# Altium footprint library 逸芬的库鸭.PcbLib: 255 footprints (part 3 of 20)
Each footprint in its own frame and in the unit in brackets; x right, y up, seen from the top. Pads: shape width x height; smd on the part's side, far side on the other; paste and mask are expansions set on the pad; w line width, h text height; cw(c..) or ccw(c..) is an arc to the next point about the centre after c.
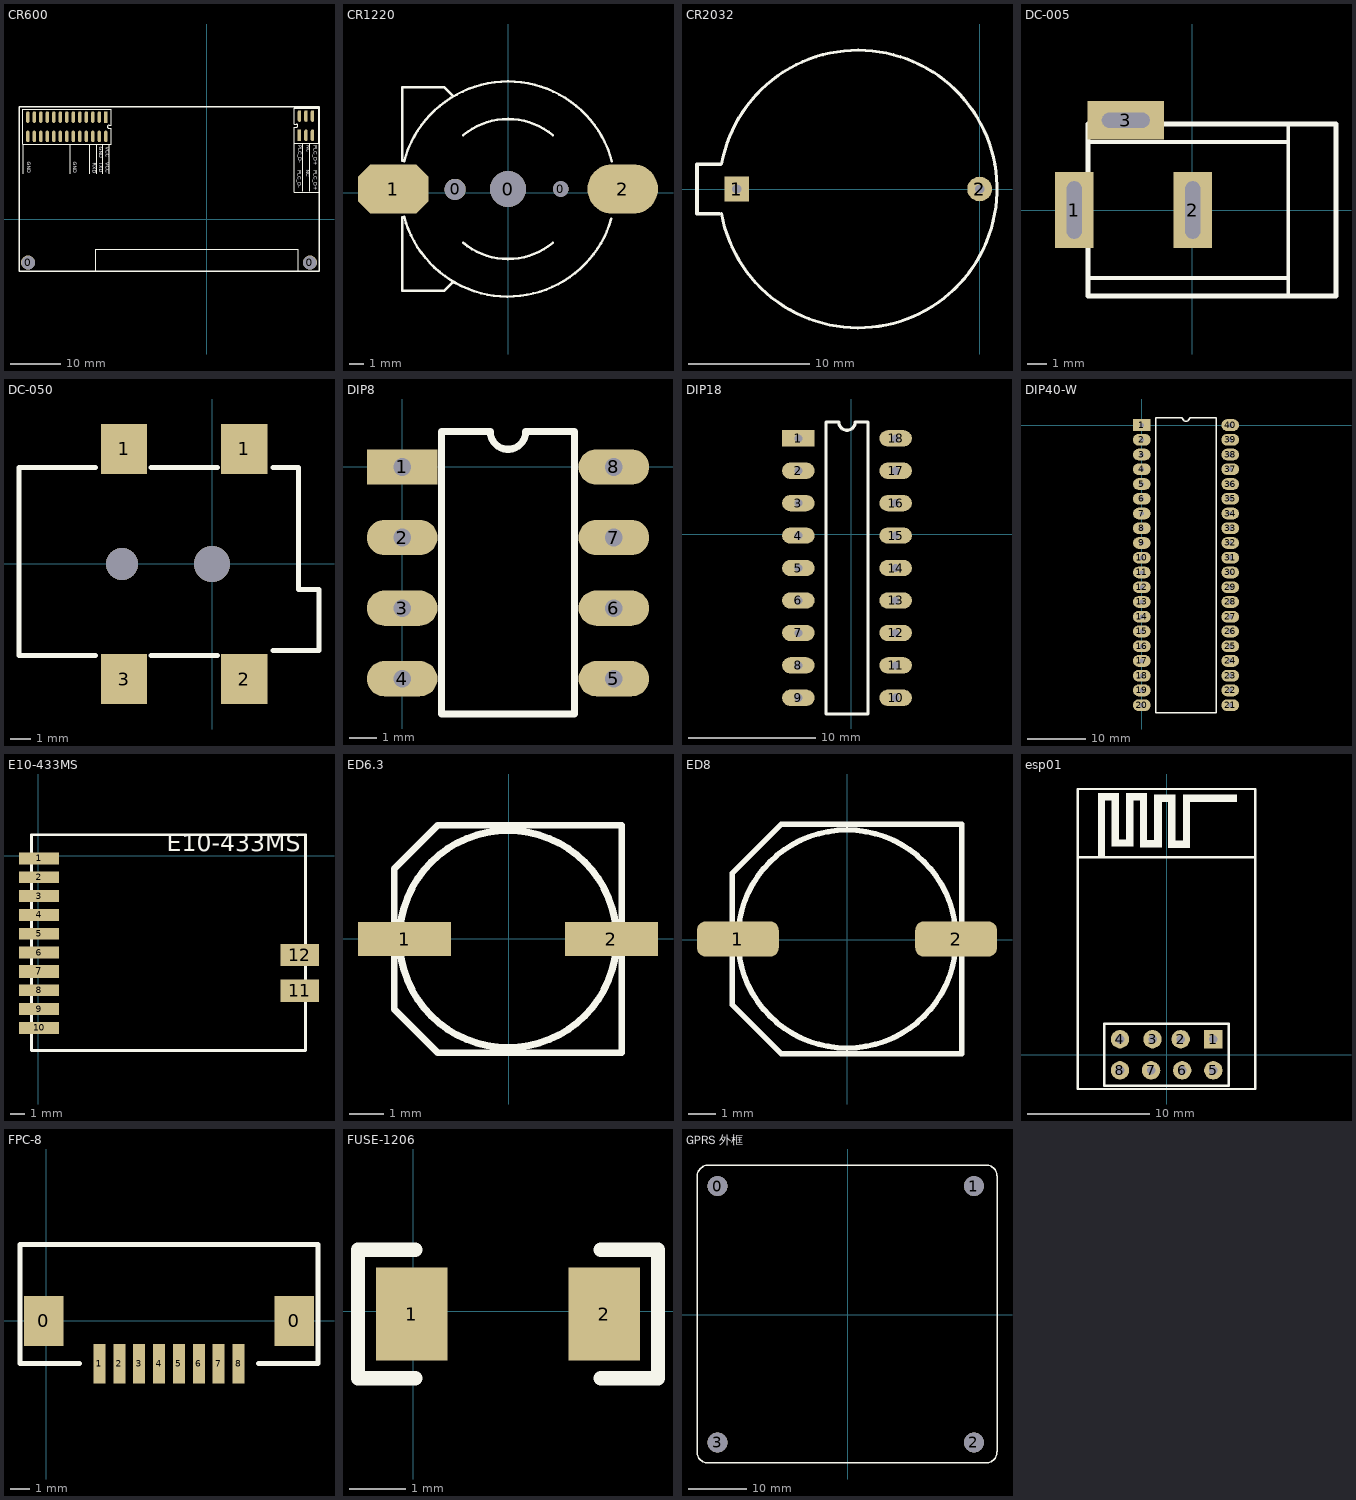
[diagram p2: the footprints below, top view; thin cyan lines are the x and y axes]

## CR600 [mm]
pads (34):
  round 2.8 hole 2.7: 0(-35.7,-8.7) 0(20.7,-8.7)
  rect 0.7x2.3 smd: 1(-20.14,20.374) 31(18.594,16.739)
  oval 0.7x2.3 smd: 2(-20.14,16.524) 3(-21.44,20.374) 4(-21.44,16.524) 5(-22.74,20.374) 6(-22.74,16.524) 7(-24.04,20.374) 8(-24.04,16.524) 9(-25.34,20.374) 10(-25.34,16.524) 11(-26.64,20.374) 12(-26.64,16.524) 13(-27.94,20.374) 14(-27.94,16.524) 15(-29.24,20.374) 16(-29.24,16.524) 17(-30.54,20.374) 18(-30.54,16.524) 19(-31.84,20.374) 20(-31.84,16.524) 21(-33.14,20.374) 22(-33.14,16.524) 23(-34.44,20.374) 24(-34.44,16.524) 25(-35.74,20.374) 26(-35.74,16.524) 32(18.594,20.589) 33(19.894,16.739) 34(19.894,20.589) 35(21.194,16.739) 36(21.194,20.589)
Top Overlay:
  lines w0.127: -36.7,9.1 -36.7,14.9 ; -27.3,9.1 -27.3,14.9 ; -23.4,9.1 -23.4,14.9 ; -22.2,-10.5 -22.2,-6 18.4,-6 18.4,-10.5 ; -22,9.1 -22,14.9 ; -20.8,9.1 -20.8,14.9 ; -19.5,9.1 -19.5,14.9 ; 17.5,15.113 17.5,5.4 22.5,5.4 ; 19.3,5.51 19.3,15.1 ; 20.7,5.51 20.7,15.1
  lines w0.2: 17.5,15.113 17.5,18.339 17.944,18.339 ccw(c17.944,18.664) 17.944,18.989 17.553,18.989 17.553,22.2 ; -36.726,14.913 -36.726,22 -19.099,22 -19.099,18.774 -19.49,18.774 ccw(c-19.49,18.449) -19.49,18.124 -19.099,18.124 -19.099,14.913 -36.726,14.913
  lines w0.203: 17.5,15.113 22.455,15.113
  lines w0.254: 17.553,22.2 22.379,22.2 ; 22.43,15.139 22.455,15.113 22.455,22.124 ; -37.5,-10.5 22.5,-10.5 22.5,22.5 -37.5,22.5 -37.5,-10.5
  text "NC" at 19.6,9.804 h1.27
  text "PLC_D-" at 18,9.8 h1.27
  text "PLC_D+" at 21.1,9.8 h1.27
  text "GND" at -36.2,11.5 h1.27
  text "GND" at -27,11.5 h1.27
  text "RXD" at -23.1,11.3 h1.27
  text "GND" at -21.8,14.404 h1.27
  text "TXD" at -21.8,11.304 h1.27
  text "VCC" at -20.5,11.304 h1.27
  text "VCC" at -20.5,14.404 h1.27
  text "PLC_D+" at 21.1,14.7 h1.27
  text "PLC_D-" at 18.1,14.7 h1.27
  text "NC" at 19.7,14.704 h1.27

## CR1220 [mm]
pads (5):
  round 1.5 hole 1.5: 0(-3.75,0.229)
  round 2.54 hole 2.54: 0(0,0.254)
  round 1.1 hole 1.1: 0(3.75,0.254)
  oct 5x3.5 smd: 1(-8.128,0.254)
  oval 5x3.5 smd: 2(8.128,0.254)
Top Overlay:
  lines w0.178: -7.5,-1.746 -7.5,-6.946 -4.5,-6.946 -3.925,-6.371 ; -7.5,2.254 -7.5,7.454 -4.5,7.454 -3.9,6.854 ; -7.363,-1.709 ccw(c0,0.254) 7.327,-1.839 ; -7.363,2.217 cw(c0,0.254) 0,7.874 cw(c0,0.254) 7.363,2.217 ; -3.175,-3.556 ccw(c0,0.254) 3.172,-3.558 ; -3.169,4.069 cw(c0,0.254) 3.172,4.066
3D body "CR1220.STEP": height 4.19, standoff -0.75, extent -9.377,-7.377 9.123,7.62

## CR2032 [mil]
pads (2):
  rect 80x80 hole 30: 1(-787.4,0)
  round 80 hole 30: 2(0,0)
Top Overlay:
  lines w10: -836.69,-79.11 ccw(c-393.7,0) -836.43,80.58
  lines w12: -844,-80 -916,-80 -916,80.57 -838.73,80.57
3D body "User Library-CR2032_HOR_HOLD.STEP": height 334.65, standoff -157.48, extent -915.5,-429.07 49.07,437.08

## DC-005 [mm]
pads (3):
  rect 2x4 hole 0.8 slot 3 at 90 deg: 1(-6.175,0) 2(0.025,0)
  rect 4x2 hole 0.8 slot 2.5 at 0 deg: 3(-3.475,4.7)
Top Overlay:
  lines w0.2: -5.459,-3.556 5.025,-3.556 ; -5.459,3.556 5.025,3.556 ; 5.025,-4.5 5.025,4.5
  lines w0.254: -5.459,-4.5 7.525,-4.5 7.525,4.5 -5.459,4.5 -5.459,-4.5
3D body "dc-005.STEP": height 11.2, standoff -3.8, extent -6.525,-4.5 7.525,4.8

## DC-050 [mm] "贴片DC005  5.5*2.1"
pads (4):
  rect 2.3x2.5 smd: 1(-4.4,5.75) 1(1.6,5.75) 2(1.6,-5.75) 3(-4.4,-5.75)
via -4.5,0 diameter 1.6 hole 1.6
via 0,0 diameter 1.8 hole 1.8
Top Overlay:
  lines w0.254: -5.842,-4.572 -9.652,-4.572 -9.652,4.826 -5.842,4.826 ; -3.048,-4.572 0.254,-4.572 ; -3.048,4.826 0.254,4.826 ; 3.048,-4.318 5.334,-4.318 5.334,-1.27 4.318,-1.27 4.318,4.826 3.048,4.826
3D body "dc-050.STEP": height 11, standoff -1.4, extent -9.5,-6.3 5.3,6.3

## DIP8 [mm]
pads (8):
  rect 2.54x1.27 hole 0.635: 1(0,0)
  oval 2.54x1.27 hole 0.635: 2(0,-2.54) 3(0,-5.08) 4(0,-7.62) 5(7.62,-7.62) 6(7.62,-5.08) 7(7.62,-2.54) 8(7.62,0)
Top Overlay:
  lines w0.254: 1.422,-8.89 1.422,1.27 3.175,1.27 ccw(c3.81,1.27) 4.445,1.27 6.198,1.27 6.198,-8.89 1.422,-8.89
3D body "DIP-8.STEP": height 4.56, standoff -3.82, extent 0.003,-8.765 7.823,1.145

## DIP10 [mm]

## DIP18 [mil]
pads (18):
  rect 100x50 hole 25: 1(-163,295)
  oval 100x50 hole 25: 2(-163,195) 3(-163,95) 4(-163,-5) 5(-163,-105) 6(-163,-205) 7(-163,-305) 8(-163,-405) 9(-163,-505) 10(137,-505) 11(137,-405) 12(137,-305) 13(137,-205) 14(137,-105) 15(137,-5) 16(137,95) 17(137,195) 18(137,295)
Top Overlay:
  lines w10: -78,-555 -78,345 -38,345 ccw(c-13,345) 12,345 52,345 52,-555 -78,-555
3D body "User Library-DIP18-1.STEP": height 179.92, standoff -150, extent -163.93,-565.48 143.94,349.49

## DIP40-W [mil]
pads (40):
  rect 120x80 hole 30: 1(0,0)
  oval 120x80 hole 30: 2(0,-100) 3(0,-200) 4(0,-300) 5(0,-400) 6(0,-500) 7(0,-600) 8(0,-700) 9(0,-800) 10(0,-900) 11(0,-1000) 12(0,-1100) 13(0,-1200) 14(0,-1300) 15(0,-1400) 16(0,-1500) 17(0,-1600) 18(0,-1700) 19(0,-1800) 20(0,-1900) 21(600,-1900) 22(600,-1800) 23(600,-1700) 24(600,-1600) 25(600,-1500) 26(600,-1400) 27(600,-1300) 28(600,-1200) 29(600,-1100) 30(600,-1000) 31(600,-900) 32(600,-800) 33(600,-700) 34(600,-600) 35(600,-500) 36(600,-400) 37(600,-300) 38(600,-200) 39(600,-100) 40(600,0)
Top Overlay:
  lines w10: 95,-1950 505,-1950 505,50 325,50 cw(c300,50) 275,50 95,50 95,-1950
3D body "User Library-DIP-40.STEP": height 195.08, standoff -94.49, extent -6.7,-1968.74 604.72,88.74

## E10-433MS [mm]
pads (12):
  rect 2.7x0.8 smd: 1(0.068,-0.188) 2(0.068,-1.458) 3(0.068,-2.728) 4(0.068,-3.998) 5(0.068,-5.268) 6(0.068,-6.538) 8(0.068,-9.078) 9(0.068,-10.348) 10(0.068,-11.618)
  rect 2.7x0.9 smd: 7(0.068,-7.808)
  rect 2.6x1.5 smd: 11(17.64,-9.113) 12(17.64,-6.703)
Top Overlay:
  lines w0.2: -0.452,1.367 -0.452,-13.143 18.018,-13.143 18.018,1.407 -0.452,1.407
  text "E10-433MS" at 8.675,-0.1 h2
3D body: height 0.76, standoff 0, extent -0.45,-13.15 17.975,1.425
3D body: height 1.27, standoff 0, extent 3.05,-6.1 6.65,-2.65

## ED6.3 [mm]
pads (2):
  rect 2.7x1 smd: 1(-3.015,-0.003) 2(2.985,-0.003)
Top Overlay:
  circle w0.2: c-0.015,-0.003 r3.15
  lines w0.2: -3.315,2.029 -3.315,-2.035 -2.047,-3.303 3.285,-3.303 3.285,3.297 -2.047,3.297 -3.303,2.042
3D body "SL-E.step": height 5.2, standoff 0, extent -3.515,-3.305 3.485,3.295

## ED8 [mm]
pads (2):
  rrect50% 3x1.3 smd: 1(-4.005,0.028) 2(3.995,0.028)
Top Overlay:
  circle w0.2: c-0.005,0.028 r4
  lines w0.2: -4.205,-2.385 -4.205,2.441 -2.418,4.228 4.195,4.228 4.195,-4.172 -2.418,-4.172 -4.205,-2.385
3D body "SL-H.step": height 10.5, standoff 0, extent -4.526,-4.188 4.474,4.112

## esp01 [mm] "esp01 wifi模块"
pads (8):
  rect 1.5x1.5 hole 0.7: 1(3.81,1.27)
  round 1.5 hole 0.7: 2(1.15,1.27) 3(-1.15,1.27) 4(-3.81,1.27) 5(3.81,-1.27) 6(1.27,-1.27) 7(-1.27,-1.27) 8(-3.81,-1.27)
Top Overlay:
  rectangle: -5.599,16.129 -5.015,21.361
  rectangle: -5.015,20.777 -3.897,21.361
  rectangle: -4.507,17.018 -3.897,20.777
  rectangle: -3.897,17.018 -2.703,17.602
  rectangle: -3.313,17.602 -2.703,21.361
  rectangle: -2.703,20.777 -1.586,21.361
  rectangle: -2.17,16.942 -1.586,20.777
  rectangle: -1.586,16.942 -0.392,17.526
  rectangle: -1.027,17.526 -0.392,21.26
  rectangle: -0.392,20.65 0.726,21.26
  rectangle: 0.116,16.891 0.726,20.65
  rectangle: 0.726,16.891 1.919,17.501
  rectangle: 1.335,17.501 1.919,21.26
  rectangle: 1.919,20.65 5.755,21.26
  lines w0.2: -7.25,16.129 7.25,16.129 ; -7.25,-2.794 7.25,-2.794 7.25,21.706 -7.25,21.706 -7.25,-2.794 ; -5.08,-2.54 -5.08,2.54 5.08,2.54 5.08,-2.54 -5.08,-2.54

## FPC-8 [mm]
pads (10):
  rect 2x2.5 smd: 0(-0.133,-0.009) 0(12.467,-0.009)
  rect 0.6x2 smd: 1(2.667,-2.159) 2(3.667,-2.159) 3(4.667,-2.159) 4(5.667,-2.159) 5(6.667,-2.159) 6(7.667,-2.159) 7(8.667,-2.159) 8(9.667,-2.159)
Top Overlay:
  lines w0.254: 1.667,-2.159 -1.333,-2.159 -1.333,3.841 13.667,3.841 13.667,-2.159 10.667,-2.159

## FUSE-1206 [mil]
pads (2):
  rect 50x65 smd: 1(-1,-2) 2(134,-2)
Top Overlay:
  lines w10: 1.5,-47 -38.5,-47 -38.5,43 1.5,43 ; 131.5,-47 171.5,-47 171.5,43 131.5,43
3D body "9.STEP": height 34.25, standoff 0, extent 1.01,-35.78 126.99,28

## GPRS 外框 [mm]
pads (4):
  round 3.45 hole 3.42: 0(-22.466,22.203) 1(21.73,22.203) 2(21.73,-21.993) 3(-22.466,-21.993)
Top Overlay:
  lines w0.254: -26,-23.6 ccw(c-24.1,-23.6) -24.1,-25.5 23.8,-25.5 ccw(c23.8,-23.6) 25.7,-23.6 25.7,23.952 ccw(c23.852,23.952) 23.852,25.8 -24,25.8 ccw(c-24,23.8) -26,23.8 -26,-23.6
3D body: height 10, standoff 8, extent -25.857,-25.629 25.806,25.781
3D body: height 8, standoff 0, extent -24.111,-23.717 -20.715,-20.319
3D body: height 8, standoff 0, extent 20.085,-23.717 23.481,-20.319
3D body: height 8, standoff 0, extent 19.984,20.505 23.379,23.902
3D body: height 8, standoff 0, extent -24.162,20.505 -20.766,23.902